# Altium footprint library Connectors Pad Lib.PcbLib: 211 footprints (part 2 of 14)
Each footprint in its own frame and in the unit in brackets; x right, y up, seen from the top. Pads: shape width x height; smd on the part's side, far side on the other; paste and mask are expansions set on the pad; w line width, h text height; cw(c..) or ccw(c..) is an arc to the next point about the centre after c.
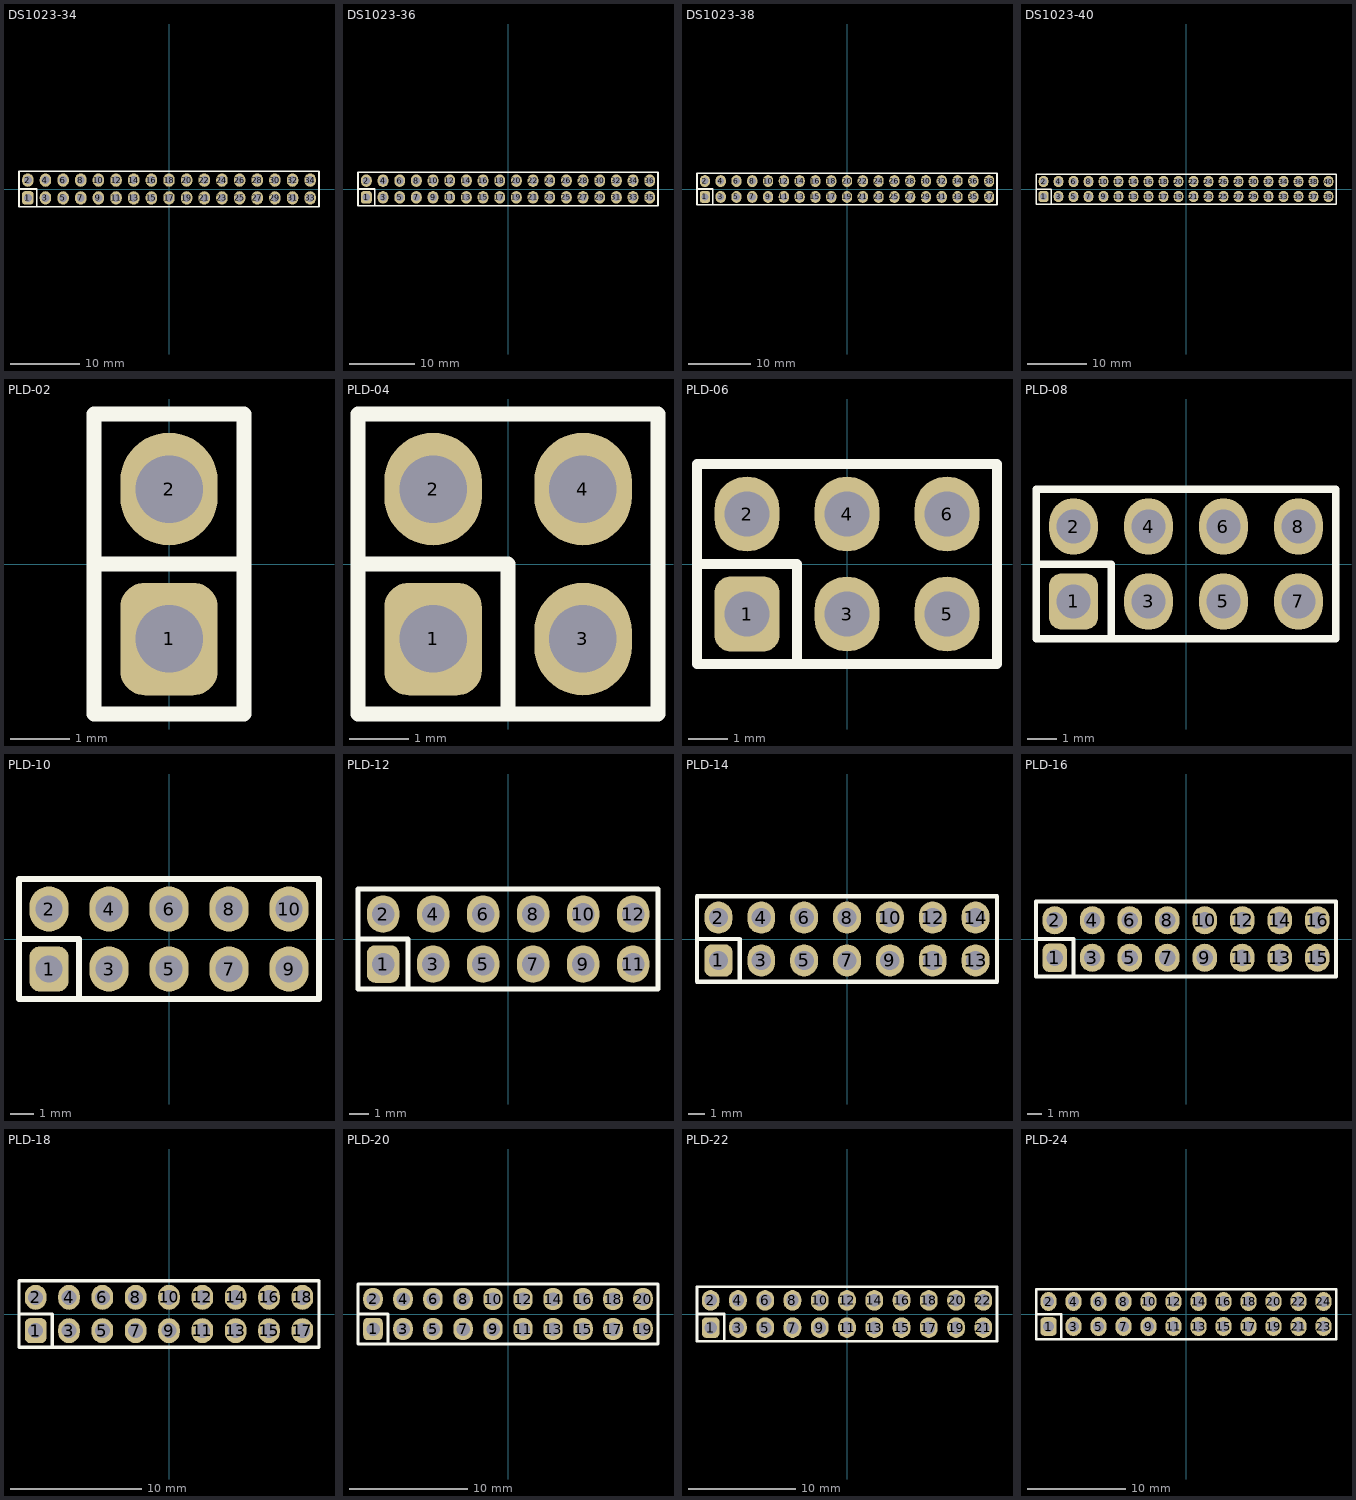
[diagram p1: the footprints below, top view; thin cyan lines are the x and y axes]

## DS1023-34 [mil]
pads (34):
  rrect50% 65x75 hole 45: 1(-800,-50)
  oval 65x75 hole 45: 2(-800,50) 3(-700,-50) 4(-700,50) 5(-600,-50) 6(-600,50) 7(-500,-50) 8(-500,50) 9(-400,-50) 10(-400,50) 11(-300,-50) 12(-300,50) 13(-200,-50) 14(-200,50) 15(-100,-50) 16(-100,50) 17(0,-50) 18(0,50) 19(100,-50) 20(100,50) 21(200,-50) 22(200,50) 23(300,-50) 24(300,50) 25(400,-50) 26(400,50) 27(500,-50) 28(500,50) 29(600,-50) 30(600,50) 31(700,-50) 32(700,50) 33(800,-50) 34(800,50)
Top Overlay:
  lines w10: -850,0 -750,0 -750,-100 ; -850,-100 -850,100 850,100 850,-100 -850,-100
3D body "DS-1023-34.STEP": height 335.65, standoff -117.11, extent -850,-98.43 850,98.43

## DS1023-36 [mil]
pads (36):
  rrect50% 65x75 hole 45: 1(-850,-50)
  oval 65x75 hole 45: 2(-850,50) 3(-750,-50) 4(-750,50) 5(-650,-50) 6(-650,50) 7(-550,-50) 8(-550,50) 9(-450,-50) 10(-450,50) 11(-350,-50) 12(-350,50) 13(-250,-50) 14(-250,50) 15(-150,-50) 16(-150,50) 17(-50,-50) 18(-50,50) 19(50,-50) 20(50,50) 21(150,-50) 22(150,50) 23(250,-50) 24(250,50) 25(350,-50) 26(350,50) 27(450,-50) 28(450,50) 29(550,-50) 30(550,50) 31(650,-50) 32(650,50) 33(750,-50) 34(750,50) 35(850,-50) 36(850,50)
Top Overlay:
  lines w10: -900,0 -800,0 -800,-100 ; -900,-100 -900,100 900,100 900,-100 -900,-100
3D body "DS-1023-36.STEP": height 335.65, standoff -117.11, extent -900,-98.43 900,98.43

## DS1023-38 [mil]
pads (38):
  rrect50% 65x75 hole 45: 1(-900,-50)
  oval 65x75 hole 45: 2(-900,50) 3(-800,-50) 4(-800,50) 5(-700,-50) 6(-700,50) 7(-600,-50) 8(-600,50) 9(-500,-50) 10(-500,50) 11(-400,-50) 12(-400,50) 13(-300,-50) 14(-300,50) 15(-200,-50) 16(-200,50) 17(-100,-50) 18(-100,50) 19(0,-50) 20(0,50) 21(100,-50) 22(100,50) 23(200,-50) 24(200,50) 25(300,-50) 26(300,50) 27(400,-50) 28(400,50) 29(500,-50) 30(500,50) 31(600,-50) 32(600,50) 33(700,-50) 34(700,50) 35(800,-50) 36(800,50) 37(900,-50) 38(900,50)
Top Overlay:
  lines w10: -950,0 -850,0 -850,-100 ; -950,-100 -950,100 950,100 950,-100 -950,-100
3D body "DS-1023-38.STEP": height 335.65, standoff -117.11, extent -950,-98.43 950,98.43

## DS1023-40 [mil]
pads (40):
  rrect50% 65x75 hole 45: 1(-950,-50)
  oval 65x75 hole 45: 2(-950,50) 3(-850,-50) 4(-850,50) 5(-750,-50) 6(-750,50) 7(-650,-50) 8(-650,50) 9(-550,-50) 10(-550,50) 11(-450,-50) 12(-450,50) 13(-350,-50) 14(-350,50) 15(-250,-50) 16(-250,50) 17(-150,-50) 18(-150,50) 19(-50,-50) 20(-50,50) 21(50,-50) 22(50,50) 23(150,-50) 24(150,50) 25(250,-50) 26(250,50) 27(350,-50) 28(350,50) 29(450,-50) 30(450,50) 31(550,-50) 32(550,50) 33(650,-50) 34(650,50) 35(750,-50) 36(750,50) 37(850,-50) 38(850,50) 39(950,-50) 40(950,50)
Top Overlay:
  lines w10: -1000,0 -900,0 -900,-100 ; -1000,-100 -1000,100 1000,100 1000,-100 -1000,-100
3D body "DS-1023-40.STEP": height 335.65, standoff -117.11, extent -1000,-98.43 1000,98.43

## PLD-02 [mil] "PCB Vertical Dual Connector 2-Pin"
height 336.22
pads (2):
  rrect50% 65x75 hole 45: 1(0,-50)
  oval 65x75 hole 45: 2(0,50)
Top Overlay:
  lines w10: -50,0 50,0 ; -50,-100 -50,100 50,100 50,-100 -50,-100
3D body "PLD-02.STEP": height 341.16, standoff -117.11, extent -50,-98.43 50,98.43

## PLD-04 [mil] "PCB Vertical Dual Connector 4-Pin"
height 336.22
pads (4):
  rrect50% 65x75 hole 45: 1(-50,-50)
  oval 65x75 hole 45: 2(-50,50) 3(50,-50) 4(50,50)
Top Overlay:
  lines w10: -100,0 0,0 0,-100 ; -100,-100 100,-100 100,100 -100,100 -100,-100
3D body "PLD-04.STEP": height 341.16, standoff -117.11, extent -100,-98.43 100,98.43

## PLD-06 [mil] "PCB Vertical Dual Connector 6-Pin"
height 336.22
pads (6):
  rrect50% 65x75 hole 45: 1(-100,-50)
  oval 65x75 hole 45: 2(-100,50) 3(0,-50) 4(0,50) 5(100,-50) 6(100,50)
Top Overlay:
  lines w10: -150,0 -50,0 -50,-100 ; -150,-100 150,-100 150,100 -150,100 -150,-100
3D body "PLD-06.STEP": height 341.16, standoff -117.11, extent -150,-98.43 150,98.43

## PLD-08 [mil] "PCB Vertical Dual Connector 8-Pin"
height 336.22
pads (8):
  rrect50% 65x75 hole 45: 1(-150,-50)
  oval 65x75 hole 45: 2(-150,50) 3(-50,-50) 4(-50,50) 5(50,-50) 6(50,50) 7(150,-50) 8(150,50)
Top Overlay:
  lines w10: -200,0 -100,0 -100,-100 ; -200,-100 -200,100 200,100 200,-100 -200,-100
3D body "PLD-08.STEP": height 341.16, standoff -117.11, extent -200,-98.43 200,98.43

## PLD-10 [mil] "PCB Vertical Dual Connector 10-Pin"
height 336.22
pads (10):
  rrect50% 65x75 hole 45: 1(-200,-50)
  oval 65x75 hole 45: 2(-200,50) 3(-100,-50) 4(-100,50) 5(0,-50) 6(0,50) 7(100,-50) 8(100,50) 9(200,-50) 10(200,50)
Top Overlay:
  lines w10: -250,0 -150,0 -150,-100 ; -250,-100 -250,100 250,100 250,-100 -250,-100
3D body "PLD-10.STEP": height 341.16, standoff -117.11, extent -250,-98.43 250,98.43

## PLD-12 [mil] "PCB Vertical Dual Connector 12-Pin"
height 336.22
pads (12):
  rrect50% 65x75 hole 45: 1(-250,-50)
  oval 65x75 hole 45: 2(-250,50) 3(-150,-50) 4(-150,50) 5(-50,-50) 6(-50,50) 7(50,-50) 8(50,50) 9(150,-50) 10(150,50) 11(250,-50) 12(250,50)
Top Overlay:
  lines w10: -300,0 -200,0 -200,-100 ; -300,-100 -300,100 300,100 300,-100 -300,-100
3D body "PLD-12.STEP": height 341.16, standoff -117.11, extent -300,-98.43 300,98.43

## PLD-14 [mil] "PCB Vertical Dual Connector 14-Pin"
height 336.22
pads (14):
  rrect50% 65x75 hole 45: 1(-300,-50)
  oval 65x75 hole 45: 2(-300,50) 3(-200,-50) 4(-200,50) 5(-100,-50) 6(-100,50) 7(0,-50) 8(0,50) 9(100,-50) 10(100,50) 11(200,-50) 12(200,50) 13(300,-50) 14(300,50)
Top Overlay:
  lines w10: -350,0 -250,0 -250,-100 ; -350,-100 -350,100 350,100 350,-100 -350,-100
3D body "PLD-14.STEP": height 341.16, standoff -117.11, extent -350,-98.43 350,98.43

## PLD-16 [mil] "PCB Vertical Dual Connector 16-Pin"
height 336.22
pads (16):
  rrect50% 65x75 hole 45: 1(-350,-50)
  oval 65x75 hole 45: 2(-350,50) 3(-250,-50) 4(-250,50) 5(-150,-50) 6(-150,50) 7(-50,-50) 8(-50,50) 9(50,-50) 10(50,50) 11(150,-50) 12(150,50) 13(250,-50) 14(250,50) 15(350,-50) 16(350,50)
Top Overlay:
  lines w10: -400,0 -300,0 -300,-100 ; -400,-100 -400,100 400,100 400,-100 -400,-100
3D body "PLD-16.STEP": height 341.16, standoff -117.11, extent -400,-98.43 400,98.43

## PLD-18 [mil] "PCB Vertical Dual Connector 18-Pin"
height 336.22
pads (18):
  rrect50% 65x75 hole 45: 1(-400,-50)
  oval 65x75 hole 45: 2(-400,50) 3(-300,-50) 4(-300,50) 5(-200,-50) 6(-200,50) 7(-100,-50) 8(-100,50) 9(0,-50) 10(0,50) 11(100,-50) 12(100,50) 13(200,-50) 14(200,50) 15(300,-50) 16(300,50) 17(400,-50) 18(400,50)
Top Overlay:
  lines w10: -450,0 -350,0 -350,-100 ; -450,-100 450,-100 450,100 -450,100 -450,-100
3D body "PLD-18.STEP": height 341.16, standoff -117.11, extent -450,-98.43 450,98.43

## PLD-20 [mil] "PCB Vertical Dual Connector 20-Pin"
height 336.22
pads (20):
  rrect50% 65x75 hole 45: 1(-450,-50)
  oval 65x75 hole 45: 2(-450,50) 3(-350,-50) 4(-350,50) 5(-250,-50) 6(-250,50) 7(-150,-50) 8(-150,50) 9(-50,-50) 10(-50,50) 11(50,-50) 12(50,50) 13(150,-50) 14(150,50) 15(250,-50) 16(250,50) 17(350,-50) 18(350,50) 19(450,-50) 20(450,50)
Top Overlay:
  lines w10: -500,0 -400,0 -400,-100 ; -500,-100 -500,100 500,100 500,-100 -500,-100
3D body "PLD-20.STEP": height 341.16, standoff -117.11, extent -500,-98.43 500,98.43

## PLD-22 [mil] "PCB Vertical Dual Connector 22-Pin"
height 336.22
pads (22):
  rrect50% 65x75 hole 45: 1(-500,-50)
  oval 65x75 hole 45: 2(-500,50) 3(-400,-50) 4(-400,50) 5(-300,-50) 6(-300,50) 7(-200,-50) 8(-200,50) 9(-100,-50) 10(-100,50) 11(0,-50) 12(0,50) 13(100,-50) 14(100,50) 15(200,-50) 16(200,50) 17(300,-50) 18(300,50) 19(400,-50) 20(400,50) 21(500,-50) 22(500,50)
Top Overlay:
  lines w10: -550,0 -450,0 -450,-100 ; -550,-100 -550,100 550,100 550,-100 -550,-100
3D body "PLD-22.STEP": height 341.16, standoff -117.11, extent -550,-98.43 550,98.43

## PLD-24 [mil] "PCB Vertical Dual Connector 24-Pin"
height 336.22
pads (24):
  rrect50% 65x75 hole 45: 1(-550,-50)
  oval 65x75 hole 45: 2(-550,50) 3(-450,-50) 4(-450,50) 5(-350,-50) 6(-350,50) 7(-250,-50) 8(-250,50) 9(-150,-50) 10(-150,50) 11(-50,-50) 12(-50,50) 13(50,-50) 14(50,50) 15(150,-50) 16(150,50) 17(250,-50) 18(250,50) 19(350,-50) 20(350,50) 21(450,-50) 22(450,50) 23(550,-50) 24(550,50)
Top Overlay:
  lines w10: -600,0 -500,0 -500,-100 ; -600,-100 600,-100 600,100 -600,100 -600,-100
3D body "PLD-24.STEP": height 341.16, standoff -117.11, extent -600,-98.43 600,98.43